# Altium footprint library CADTcommon.PcbLib: 503 footprints (part 6 of 32)
Each footprint in its own frame and in the unit in brackets; x right, y up, seen from the top. Pads: shape width x height; smd on the part's side, far side on the other; paste and mask are expansions set on the pad; w line width, h text height; cw(c..) or ccw(c..) is an arc to the next point about the centre after c.
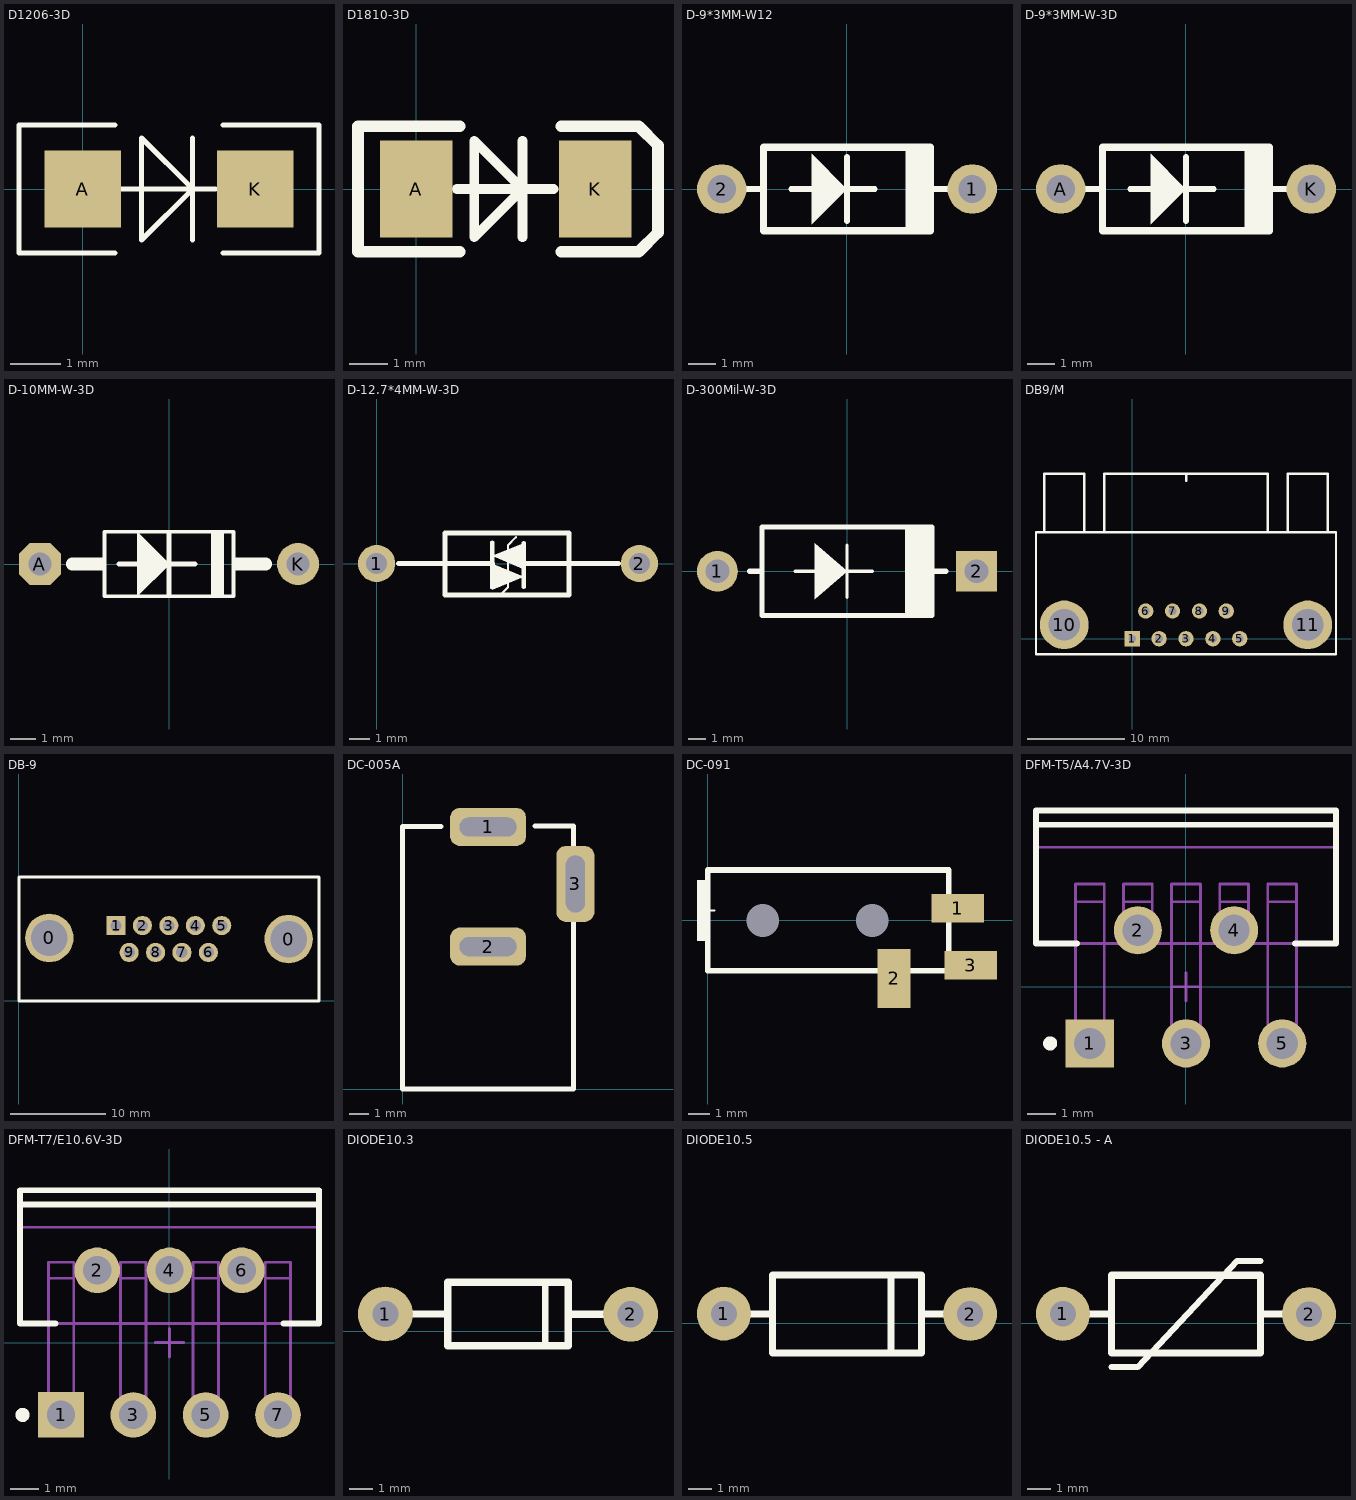
[diagram p5: the footprints below, top view; thin cyan lines are the x and y axes]

## D1206-3D [mil]
pads (2):
  rect 60x60 smd: A(0,0) K(135,0)
Top Overlay:
  lines w3.94: 25,-50 -50,-50 -50,50 25,50 ; 30,0 104,0 ; 86,-40 86,0 ; 86,40 86,0 ; 110,-50 185,-50 185,50 110,50 ; 86,0 46,-40 46,40 86,0
3D body: height 59.06, standoff 0, extent 1.1,-30 138.9,29.06

## D1810-3D [mil]
pads (2):
  rect 75x100 smd: A(0,0) K(185,0)
Top Overlay:
  lines w10: 42,0 60,0 110,0 ; 110,-50 110,50 ; 142,0 110,0 ; 110,0 60,-50 60,50 110,0
  lines w12: 45,-65 -60,-65 -60,65 45,65 ; 150,-65 230,-65 250,-45 250,45 230,65 150,65
3D body: height 98.43, standoff 0, extent -18.24,-76 202.24,77.54

## D-9*3MM-W12 [mil] "1N4001系列"
height 118.11
pads (2):
  round 70 hole 39.37: 1(177.17,0)
  round 70 hole 40: 2(-177.17,0)
Top Overlay:
  rectangle: 87,-59.06 118.11,59.06
  region: 0,0 -50,50 -50,-50
  lines w7.87: -142,0 -118.11,0 ; -78.74,0 39.37,0 ; 0,-45.28 0,45.28 ; 119.11,0 142,0
  lines w10: 88,-59.06 88,59.06 ; -118.11,-59.06 118.11,-59.06 118.11,59.06 -118.11,59.06 -118.11,-59.06
3D body: height 100.5, standoff -100, extent -217,-50 213,51

## D-9*3MM-W-3D [mil] "1N4001系列"
height 118.11
pads (2):
  round 70 hole 40: A(-177.17,0)
  round 70 hole 39.37: K(177.17,0)
Top Overlay:
  rectangle: 87,-59.06 118.11,59.06
  region: 0,0 -50,50 -50,-50
  lines w7.87: -142,0 -118.11,0 ; -78.74,0 39.37,0 ; 0,-45.28 0,45.28 ; 119.11,0 142,0
  lines w10: 88,-59.06 88,59.06 ; -118.11,-59.06 118.11,-59.06 118.11,59.06 -118.11,59.06 -118.11,-59.06
3D body: height 100.5, standoff -100, extent -217,-50 213,51

## D-10MM-W-3D [mil]
pads (2):
  oct 65x65 hole 35: A(-200,0)
  round 65 hole 35: K(200,0)
Top Overlay:
  rectangle: 100,-10 113,10
  region: -100,10 -113,10 -113,-10 -100,-10
  region: 85,50 65,50 65,-50 85,-50
  region: 1,0 -49,50 -49,-50
  lines w6: -100,-50 -100,50 100,50 100,-50 -100,-50
  lines w7.87: -77.74,0 40.37,0 ; 0,-45.28 0,45.28
  lines w20: -150,0 -113,0 ; 113,0 150,0
3D body: height 181.1, standoff -78.74, extent -216.75,-63.98 214.75,62

## D-12.7*4MM-W-3D [mm]
height 5
pads (2):
  round 1.8 hole 1.016: 1(0,0) 2(12.7,0)
Top Overlay:
  region: 5.588,0.381 7.112,-0.279 7.112,0.991
  region: 7.112,-0.635 5.588,0 5.588,-1.27
  lines w0.1: 5.969,-1.524 6.35,-1.143 6.35,0.889 6.731,1.27
  lines w0.2: 5.588,-1.157 5.588,1.016 ; 7.112,-1.143 7.112,0.991
  lines w0.254: 1.064,0.002 5.588,-0.003 ; 7.112,-0.003 11.681,0.003 ; 3.302,-1.524 3.302,1.476 9.302,1.476 9.302,-1.524 3.302,-1.524
3D body: height 4.6, standoff -2, extent -0.4,-1.6 13.1,1.6

## D-300Mil-W-3D [mm] "1N5401 二极管封装"
height 10
pads (2):
  round 2.4 hole 1.4: 1(-7.62,0)
  rect 2.4x2.4 hole 1.4: 2(7.62,0)
Top Overlay:
  rectangle: 3.556,-2.6 5,2.6
  region: 0,0 -1.905,1.651 -1.905,-1.651
  lines w0.2: -3.048,0 1.5,0 ; 0,-1.524 0,1.524
  lines w0.305: -5.715,0 -5,0 ; 3.556,-2.565 3.556,2.6 ; 5,0 5.817,0 ; -5,-2.6 -5,2.6 5,2.6 5,-2.6 -5,-2.6
3D body: height 7.15, standoff -1.5, extent -8.204,-2.625 8.096,2.675

## DB9/M [mm]
pads (11):
  rect 1.575x1.575 hole 0.8: 1(0,0)
  round 1.575 hole 0.8: 2(2.76,0) 3(5.52,0) 4(8.28,0) 5(11.04,0) 6(1.38,2.84) 7(4.14,2.84) 8(6.9,2.84) 9(9.66,2.84)
  round 5 hole 3.25: 10(-6.98,1.42) 11(18.02,1.42)
Top Overlay:
  lines w0.254: -9.05,10.92 -9.05,16.92 -4.94,16.92 ; -4.91,10.92 -4.91,16.92 ; -2.85,10.92 -2.85,16.92 13.9,16.92 13.9,10.92 ; 5.525,16.2 5.525,16.9 ; 15.95,10.92 15.95,16.92 20.06,16.92 ; 20.09,10.92 20.09,16.92 ; -9.88,-1.58 20.92,-1.58 20.92,10.92 -9.88,10.92 -9.88,-1.58
3D body: height 12.81, standoff -2.91, extent -9.925,-2.012 20.885,17.063

## DB-9 [mm]
pads (11):
  round 5.08 hole 3.8: 0(3.205,6.604) 0(28.275,6.477)
  rect 2x2 hole 1.2: 1(10.19,7.899)
  round 2 hole 1.2: 2(12.958,7.899) 3(15.727,7.899) 4(18.496,7.899) 5(21.264,7.899) 6(19.867,5.08) 7(17.099,5.08) 8(14.33,5.08) 9(11.561,5.08)
Top Overlay:
  lines w0.3: 0.03,0 0.03,12.979 31.45,12.979 31.45,0 0.03,0
3D body: height 11.9, standoff -3.8, extent 0.399,0.229 31.199,12.729

## DC-005A [mm]
pads (3):
  rrect50% 4x2 hole 1 slot 3 at 0 deg: 1(4.5,13.8) 2(4.5,7.5)
  rrect50% 2x4 hole 1 slot 3 at 90 deg: 3(9.1,10.8)
Top Overlay:
  lines w0.254: 2.018,13.818 0,13.818 0,0 9,0 9,8.8 ; 6.957,13.843 9,13.843 9,12.8
3D body: height 11.02, standoff -3.48, extent -0.003,0.017 9.503,13.843

## DC-091 [mm]
pads (5):
  round 0 hole 1.5 mask+0: 0(2.5,0) 0(7.5,0)
  rect 2.4x1.3 smd: 1(11.4,0.55) 3(12,-2.05)
  rect 1.5x2.7 smd: 2(8.5,-2.65)
Top Overlay:
  rectangle: -0.5,-0.95 0.1,1.85
  lines w0.1: -0.2,0.45 0.3,0.45
  lines w0.254: 0,-2.3 11,-2.3 11,2.3 0,2.3 0,-2.3
3D body: height 4.4, standoff -0.8, extent 0.025,-3.875 12.625,2.425

## DFM-T5/A4.7V-3D [mm] "TO, Thru-Hole, Vertical, Heatsink Mounted; 5 Bent Staggered Leads; Pitch 1.7 mm"
height 21.1
pads (5):
  rect 1.7x1.7 hole 1.1: 1(-3.4,-2)
  round 1.7 hole 1.1: 2(-1.7,2) 3(0,-2) 4(1.7,2) 5(3.4,-2)
Top Overlay:
  circle w0.25: c-4.8,-2 r0.125
  lines w0.2: -5.3,5.73 5.3,5.73 ; -3.854,1.53 -5.3,1.53 -5.3,6.23 5.3,6.23 5.3,1.53 3.854,1.53
Mechanical 13:
  lines w0.1: -5.3,4.93 5.3,4.93 ; -3.91,-1.685 -3.91,-2.315 -2.89,-2.315 -2.89,-1.685 ; -3.91,-1.685 -2.89,-1.685 ; -3.91,-1.685 -3.91,3.005 ; -3.91,3.005 -2.89,3.005 ; -3.91,3.005 -3.91,3.635 -2.89,3.635 -2.89,3.005 ; -2.89,-1.685 -2.89,3.005 ; -2.21,2.315 -2.21,1.685 -1.19,1.685 -1.19,2.315 ; -2.21,2.315 -1.19,2.315 ; -2.21,2.315 -2.21,3.005 ; -2.21,3.005 -1.19,3.005 ; -2.21,3.005 -2.21,3.635 -1.19,3.635 -1.19,3.005 ; -1.19,2.315 -1.19,3.005 ; -0.51,-1.685 -0.51,3.005 ; -0.51,-1.685 0.51,-1.685 ; -0.51,-1.685 -0.51,-2.315 0.51,-2.315 0.51,-1.685 ; -0.51,3.005 -0.51,3.635 0.51,3.635 0.51,3.005 ; -0.51,3.005 0.51,3.005 ; 0.51,-1.685 0.51,3.005 ; 1.19,2.315 1.19,1.685 2.21,1.685 2.21,2.315 ; 1.19,2.315 2.21,2.315 ; 1.19,2.315 1.19,3.005 ; 1.19,3.005 2.21,3.005 ; 1.19,3.005 1.19,3.635 2.21,3.635 2.21,3.005 ; 2.21,2.315 2.21,3.005 ; 2.89,-1.685 2.89,3.005 ; 2.89,-1.685 2.89,-2.315 3.91,-2.315 3.91,-1.685 ; 2.89,-1.685 3.91,-1.685 ; 2.89,3.005 3.91,3.005 ; 2.89,3.005 2.89,3.635 3.91,3.635 3.91,3.005 ; 3.91,-1.685 3.91,3.005 ; -5.3,1.53 -5.3,6.23 5.3,6.23 5.3,1.53 -5.3,1.53
Mechanical 15:
  lines w0.1: -0.5,0 0.5,0 ; 0,-0.5 0,0.5
3D body: height 5.6, standoff 1.95, extent -3.909,3.006 -2.891,3.634
3D body: height 1.72, standoff 0.63, extent 2.891,-1.684 3.909,1.529
3D body: height 1.72, standoff 0.63, extent -0.509,-1.684 0.509,1.529
3D body: height 1.72, standoff 0.63, extent -3.909,-1.684 -2.891,1.529
3D body: height 0.93, standoff 0, extent 2.891,-2.314 3.909,-1.686
3D body: height 0.93, standoff 0, extent -0.509,-2.314 0.509,-1.686
3D body: height 0.93, standoff 0, extent -3.909,-2.314 -2.891,-1.686
3D body: height 2.26, standoff 1.42, extent -0.509,1.531 0.509,3.004
3D body: height 2.26, standoff 1.42, extent -3.909,1.531 -2.891,3.004
3D body: height 2.26, standoff 1.42, extent 2.891,1.531 3.909,3.004
3D body: height 2.26, standoff 0.63, extent 1.191,2.316 2.209,3.004
3D body: height 2.26, standoff 0.63, extent -2.209,2.316 -1.191,3.004
3D body: height 0.93, standoff 0, extent -2.209,1.686 -1.191,2.314
3D body: height 0.93, standoff 0, extent 1.191,1.686 2.209,2.314
3D body: height 5.6, standoff 1.95, extent 2.891,3.006 3.909,3.634
3D body: height 5.6, standoff 1.95, extent 1.191,3.006 2.209,3.634
3D body: height 5.6, standoff 1.95, extent -0.509,3.006 0.509,3.634
3D body: height 5.6, standoff 1.95, extent -2.209,3.006 -1.191,3.634
3D body: height 14.5, standoff 5.6, extent -5.35,1.48 5.35,6.28
3D body: height 21.1, standoff 14.5, extent -5.299,4.931 5.299,6.229

## DFM-T7/E10.6V-3D [mm] "TO, Thru-Hole, Vertical, Heatsink Mounted; 7 Bent Staggered Leads; Pitch 1.27 mm"
height 21.1
pads (7):
  rect 1.6x1.6 hole 1: 1(-3.81,-2.54)
  round 1.6 hole 1: 2(-2.54,2.54) 3(-1.27,-2.54) 4(0,2.54) 5(1.27,-2.54) 6(2.54,2.54) 7(3.81,-2.54)
Top Overlay:
  circle w0.25: c-5.16,-2.54 r0.125
  lines w0.2: -5.25,4.85 5.25,4.85 ; -4,0.67 -5.25,0.67 -5.25,5.35 5.25,5.35 5.25,0.67 4,0.67
Mechanical 13:
  lines w0.1: -5.25,4.05 5.25,4.05 ; -4.255,-2.26 -4.255,-2.82 -3.365,-2.82 -3.365,-2.26 ; -4.255,-2.26 -3.365,-2.26 ; -4.255,-2.26 -4.255,2.26 ; -4.255,2.26 -3.365,2.26 ; -4.255,2.26 -4.255,2.82 -3.365,2.82 -3.365,2.26 ; -3.365,-2.26 -3.365,2.26 ; -1.715,-2.26 -1.715,-2.82 -0.825,-2.82 -0.825,-2.26 ; -1.715,-2.26 -0.825,-2.26 ; -1.715,-2.26 -1.715,2.26 ; -1.715,2.26 -0.825,2.26 ; -1.715,2.26 -1.715,2.82 -0.825,2.82 -0.825,2.26 ; -0.825,-2.26 -0.825,2.26 ; 0.825,-2.26 0.825,-2.82 1.715,-2.82 1.715,-2.26 ; 0.825,-2.26 1.715,-2.26 ; 0.825,-2.26 0.825,2.26 ; 0.825,2.26 1.715,2.26 ; 0.825,2.26 0.825,2.82 1.715,2.82 1.715,2.26 ; 1.715,-2.26 1.715,2.26 ; 3.365,-2.26 3.365,2.26 ; 3.365,-2.26 3.365,-2.82 4.255,-2.82 4.255,-2.26 ; 3.365,-2.26 4.255,-2.26 ; 3.365,2.26 4.255,2.26 ; 3.365,2.26 3.365,2.82 4.255,2.82 4.255,2.26 ; 4.255,-2.26 4.255,2.26 ; -5.25,0.67 5.25,0.67 5.25,5.35 -5.25,5.35 -5.25,0.67 ; -2.985,2.26 -2.095,2.26 -2.095,2.82 -2.985,2.82 -2.985,2.26 ; -0.445,2.26 0.445,2.26 0.445,2.82 -0.445,2.82 -0.445,2.26 ; 2.095,2.26 2.985,2.26 2.985,2.82 2.095,2.82 2.095,2.26
Mechanical 15:
  lines w0.1: -0.5,0 0.5,0 ; 0,-0.5 0,0.5
3D body: height 21.1, standoff 14.35, extent -5.249,4.051 5.249,5.349
3D body: height 5.4, standoff 3.3, extent 0.826,2.261 1.714,2.819
3D body: height 5.4, standoff 3.3, extent 3.366,2.261 4.254,2.819
3D body: height 5.4, standoff 0, extent 2.096,2.261 2.984,2.819
3D body: height 5.4, standoff 0, extent -0.444,2.261 0.444,2.819
3D body: height 5.4, standoff 3.3, extent -4.254,2.261 -3.366,2.819
3D body: height 5.4, standoff 0, extent -2.984,2.261 -2.096,2.819
3D body: height 5.4, standoff 3.3, extent -1.714,2.261 -0.826,2.819
3D body: height 3.69, standoff 2.15, extent -4.254,0.671 -3.366,2.259
3D body: height 3.69, standoff 2.15, extent -1.714,0.671 -0.826,2.259
3D body: height 3.69, standoff 2.15, extent 0.826,0.671 1.714,2.259
3D body: height 3.69, standoff 2.15, extent 3.366,0.671 4.254,2.259
3D body: height 2.45, standoff 0.45, extent 3.366,-2.259 4.254,0.669
3D body: height 2.45, standoff 0.45, extent 0.826,-2.259 1.714,0.669
3D body: height 2.45, standoff 0.45, extent -4.254,-2.259 -3.366,0.669
3D body: height 2.45, standoff 0.45, extent -1.714,-2.259 -0.826,0.669
3D body: height 0.7, standoff 0, extent 0.826,-2.819 1.714,-2.261
3D body: height 0.7, standoff 0, extent -4.254,-2.819 -3.366,-2.261
3D body: height 0.7, standoff 0, extent -1.714,-2.819 -0.826,-2.261
3D body: height 0.7, standoff 0, extent 3.366,-2.819 4.254,-2.261
3D body: height 14.35, standoff 5.4, extent -5.3,0.62 5.3,5.4

## DIODE10.3 [mm]
pads (2):
  round 2.3 hole 1.1: 1(3.251,0.724) 2(13.538,0.711)
Top Overlay:
  lines w0.254: 9.957,-0.61 9.957,2.057
  lines w0.305: 4.216,0.724 5.867,0.724 ; 10.922,0.711 12.573,0.711 ; 5.867,-0.61 5.867,2.057 10.922,2.057 10.922,-0.61 5.867,-0.61

## DIODE10.5 [mm]
pads (2):
  round 2.3 hole 1.1: 1(3.251,0.406) 2(13.767,0.394)
Top Overlay:
  lines w0.305: 4.216,0.394 5.334,0.394 ; 10.389,-1.27 10.389,2.057 ; 11.684,0.394 12.802,0.394 ; 5.334,-1.27 11.684,-1.27 11.684,2.057 5.334,2.057 5.334,-1.27

## DIODE10.5 - A [mm]
pads (2):
  round 2.3 hole 1.1: 1(3.251,0.406) 2(13.767,0.394)
Top Overlay:
  lines w0.254: 5.317,-1.871 6.446,-1.871 10.688,2.67 11.684,2.667
  lines w0.305: 4.216,0.394 5.334,0.394 ; 11.684,0.394 12.802,0.394 ; 5.334,-1.27 11.684,-1.27 11.684,2.057 5.334,2.057 5.334,-1.27